# Altium footprint library EMDC_Packages.PcbLib: 274 footprints (part 11 of 18)
Each footprint in its own frame and in the unit in brackets; x right, y up, seen from the top. Pads: shape width x height; smd on the part's side, far side on the other; paste and mask are expansions set on the pad; w line width, h text height; cw(c..) or ccw(c..) is an arc to the next point about the centre after c.
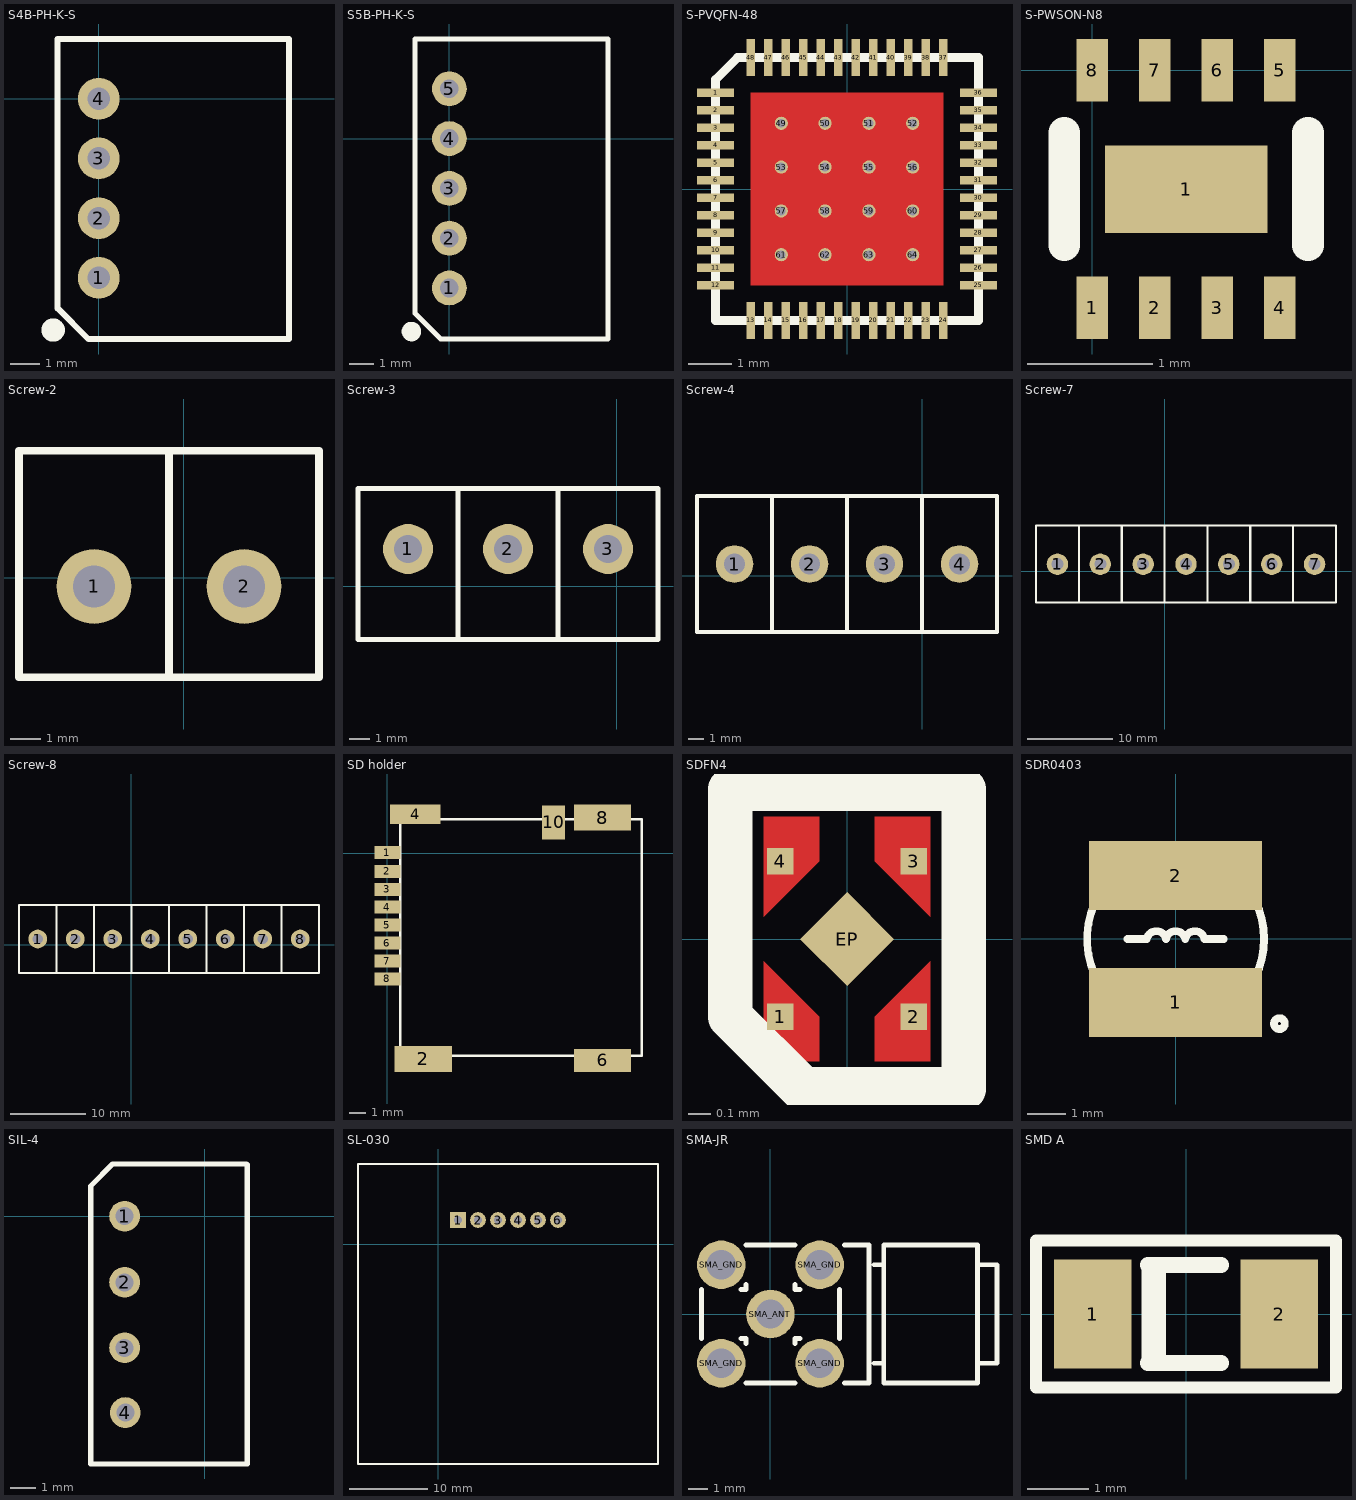
[diagram p10: the footprints below, top view; thin cyan lines are the x and y axes]

## S4B-PH-K-S [mm] "JST S4B-PH-K-S connector"
pads (4):
  round 1.4 hole 0.75: 1(0,-6) 2(0,-4) 3(0,-2) 4(0,0)
Top Overlay:
  circle w0.5: c-1.525,-7.75 r0.141
  lines w0.2: -1.375,-7.025 -0.35,-8.05 6.375,-8.05 6.375,2 -1.375,2 -1.375,-7.025
3D body "S4B-PH-K-S.STEP": height 4.8, standoff -3.4, extent -1.325,-7.95 6.275,1.95

## S5B-PH-K-S [mm] "JST S5B-PH-K-S connector"
pads (5):
  round 1.4 hole 0.75: 1(0,-6) 2(0,-4) 3(0,-2) 4(0,0) 5(0,2)
Top Overlay:
  circle w0.5: c-1.525,-7.75 r0.141
  lines w0.2: -1.375,-7.025 -1.375,4 6.375,4 6.375,-8.05 -0.35,-8.05 -1.375,-7.025
3D body "S5B-PH-K-S.STEP": height 4.8, standoff -3.4, extent -1.3,-7.95 6.3,3.95

## S-PVQFN-48 [mm] "S-PVQFN 48pin TI package"
pads (64):
  rect 0.85x0.2 smd: 1(-3,2.2) 2(-3,1.8) 3(-3,1.4) 4(-3,1) 5(-3,0.6) 6(-3,0.2) 7(-3,-0.2) 8(-3,-0.6) 9(-3,-1) 10(-3,-1.4) 11(-3,-1.8) 12(-3,-2.2) 25(3,-2.2) 26(3,-1.8) 27(3,-1.4) 28(3,-1) 29(3,-0.6) 30(3,-0.2) 31(3,0.2) 32(3,0.6) 33(3,1) 34(3,1.4) 35(3,1.8) 36(3,2.2)
  rect 0.2x0.85 smd: 13(-2.2,-3) 14(-1.8,-3) 15(-1.4,-3) 16(-1,-3) 17(-0.6,-3) 18(-0.2,-3) 19(0.2,-3) 20(0.6,-3) 21(1,-3) 22(1.4,-3) 23(1.8,-3) 24(2.2,-3) 37(2.2,3) 38(1.8,3) 39(1.4,3) 40(1,3) 41(0.6,3) 42(0.2,3) 43(-0.2,3) 44(-0.6,3) 45(-1,3) 46(-1.4,3) 47(-1.8,3) 48(-2.2,3)
  round 0.3 hole 0.2 paste+0 mask+0: 49(-1.5,1.5) 50(-0.5,1.5) 51(0.5,1.5) 52(1.5,1.5) 53(-1.5,0.5) 54(-0.5,0.5) 55(0.5,0.5) 56(1.5,0.5) 57(-1.5,-0.5) 58(-0.5,-0.5) 59(0.5,-0.5) 60(1.5,-0.5) 61(-1.5,-1.5) 62(-0.5,-1.5) 63(0.5,-1.5) 64(1.5,-1.5)
Top Layer:
  rectangle: -2.2,-2.2 2.2,2.2
Top Overlay:
  lines w0.2: -3,-3 -3,2.5 -2.5,3 3,3 3,-3 -3,-3
Top Solder:
  rectangle: -2.3,-2.3 2.3,2.3
3D body "User Library-PVQFN-N48.STEP": height 0.95, standoff -0.05, extent -3,-3 3.02,3.02

## S-PWSON-N8 [mm]
pads (9):
  rect 0.25x0.5 smd: 1(0,-1.9) 2(0.5,-1.9) 3(1,-1.9) 4(1.5,-1.9) 5(1.5,0) 6(1,0) 7(0.5,0) 8(0,0)
  rect 1.3x0.7 smd: 1(0.75,-0.95)
Top Overlay:
  lines w0.254: -0.225,-1.4 -0.225,-0.5 ; 1.725,-1.4 1.725,-0.5

## Screw-2 [mm]
pads (2):
  round 2.5 hole 1.4: 1(-3,-0.3) 2(2,-0.3)
Top Overlay:
  lines w0.254: -0.5,-3.325 -0.5,4.2 ; -5.5,-3.325 -5.5,4.225 4.5,4.225 4.5,-3.325 -5.5,-3.325
3D body "User Library-Terminal-Screw-3A-2way.STEP": height 10, standoff -3, extent -6.075,-3.3 4.525,4.3

## Screw-3 [mm]
pads (3):
  round 2.5 hole 1.4: 1(-10.45,1.875) 2(-5.45,1.875) 3(-0.45,1.875)
Top Overlay:
  lines w0.254: -7.95,-2.625 -7.95,4.9 ; -2.95,-2.6 -2.95,4.9 ; -12.95,-2.65 2.05,-2.65 2.05,4.9 -12.95,4.9 -12.95,-2.65
3D body "User Library-Terminal-Screw-3A-3way.step": height 10, standoff -3, extent -12.95,-2.7 2.65,4.9

## Screw-4 [mm]
pads (4):
  round 2.5 hole 1.4: 1(-12.5,0.8) 2(-7.5,0.8) 3(-2.5,0.8) 4(2.5,0.8)
Top Overlay:
  lines w0.254: -10,-3.7 -10,5.3 ; 0,-3.7 0,5.3 ; -5,-3.725 -15,-3.725 -15,5.325 -5,5.325 ; -5,-3.725 -5,5.325 ; -5,-3.725 5,-3.725 5,5.325 -5,5.325 ; -5,-3.725 -5,5.325
3D body "User Library-2 Way PCB Screw Terminal Block 5mm.STEP": height 15.2, standoff -3.5, extent -5,-3.7 5,5.3
3D body "User Library-2 Way PCB Screw Terminal Block 5mm.STEP": height 15.2, standoff -3.5, extent -15,-3.7 -5,5.3

## Screw-7 [mm]
pads (7):
  round 2.5 hole 1.4: 1(-12.5,0.8) 2(-7.5,0.8) 3(-2.5,0.8) 4(2.5,0.8) 5(7.5,0.8) 6(12.5,0.8) 7(17.5,0.8)
Top Overlay:
  lines w0.254: -10,-3.675 -10,5.275 ; -5,-3.65 -5,5.3 ; 5,5.275 5,-3.675 ; 10,-3.675 10,5.275 ; 10,-3.65 10,5.3 ; 15,-3.65 15,5.3 ; 0,-3.675 0,5.325 ; 0,-3.675 -15,-3.675 -15,5.325 0,5.325 ; 0,-3.675 0,5.325 ; 0,-3.675 15,-3.675 15,5.325 0,5.325 ; 5,-3.675 5,5.325 20,5.325 20,-3.675 5,-3.675
3D body "User Library-2 Way PCB Screw Terminal Block 5mm.STEP": height 15.2, standoff -3.5, extent 10,-3.7 20,5.3
3D body "User Library-2 Way PCB Screw Terminal Block 5mm.STEP": height 15.2, standoff -3.5, extent 0,-3.7 10,5.3
3D body "User Library-3 Way PCB Screw Terminal Block 5mm.STEP": height 15.2, standoff -3.5, extent -14.975,-3.675 0.025,5.325

## Screw-8 [mm]
pads (8):
  round 2.5 hole 1.4: 1(-12.5,0.8) 2(-7.5,0.8) 3(-2.5,0.8) 4(2.5,0.8) 5(7.5,0.8) 6(12.5,0.8) 7(17.5,0.8) 8(22.5,0.8)
Top Overlay:
  lines w0.254: -10,-3.7 -10,5.3 ; 0,-3.7 0,5.3 ; 10,-3.7 10,5.3 ; 20,-3.7 20,5.3 ; -5,-3.725 -15,-3.725 -15,5.325 -5,5.325 ; -5,-3.725 -5,5.325 ; -5,-3.725 5,-3.725 ; -5,-3.725 -5,5.325 ; -5,5.325 5,5.325 ; 5,-3.725 5,5.325 ; 5,-3.725 15,-3.725 ; 5,-3.725 5,5.325 ; 5,5.325 15,5.325 ; 15,-3.725 15,5.325 ; 15,-3.725 25,-3.725 25,5.325 15,5.325 ; 15,-3.725 15,5.325
3D body "User Library-2 Way PCB Screw Terminal Block 5mm.STEP": height 15.2, standoff -3.5, extent -15,-3.7 -5,5.3
3D body "User Library-2 Way PCB Screw Terminal Block 5mm.STEP": height 15.2, standoff -3.5, extent -5,-3.7 5,5.3
3D body "User Library-2 Way PCB Screw Terminal Block 5mm.STEP": height 15.2, standoff -3.5, extent 5,-3.7 15,5.3
3D body "User Library-2 Way PCB Screw Terminal Block 5mm.STEP": height 15.2, standoff -3.5, extent 15,-3.7 25,5.3

## SD holder [mm]
pads (13):
  rect 1.6x0.8 smd: 1(0,0.05) 2(0,-1.1) 3(0,-2.2) 4(0,-3.3) 5(0,-4.4) 6(0,-5.5) 7(0,-6.6) 8(0,-7.7)
  rect 3.5x1.6 smd: 2(2.2,-12.6) 8(13.2,2.2)
  rect 3.1x1.2 smd: 4(1.7,2.4)
  rect 3.5x1.4 smd: 6(13.2,-12.7)
  rect 1.4x2.1 smd: 10(10.2,1.9)
Top Overlay:
  lines w0.15: 0.8,-12.4 15.6,-12.4 15.6,2.1 0.8,2.1 0.8,-12.4

## SDFN4 [mm]
pads (5):
  rect 0.12x0.12 smd: 1(-0.3,-0.35) 2(0.3,-0.35) 3(0.3,0.35) 4(-0.3,0.35)
  rect 0.3x0.3 smd rot 45 mask+0: EP(0,0)
Top Layer:
  region: 0.375,-0.1 0.375,-0.55 0.125,-0.55 0.125,-0.35
  region: 0.375,0.1 0.375,0.55 0.125,0.55 0.125,0.35
  region: -0.375,0.1 -0.375,0.55 -0.125,0.55 -0.125,0.35
  region: -0.375,-0.1 -0.375,-0.55 -0.125,-0.55 -0.125,-0.35
Top Overlay:
  lines w0.2: -0.525,-0.35 -0.525,0.675 0.525,0.675 0.525,-0.675 -0.2,-0.675 -0.525,-0.35
Top Solder:
  rectangle: -0.5,-0.5 0.5,0.5
3D body: height 0.38, standoff 0, extent -0.4,-0.4 0.4,0.4

## SDR0403 [mm] "Bourns Inductor SDR0403 series"
pads (2):
  rect 4.5x1.8 smd: 1(0,-1.65) 2(0,1.65)
Top Overlay:
  circle w0.2: c0,0 r2.3
  circle w0.2: c2.7,-2.2 r0.141
  lines w0.2: -1.25,0 -0.75,0 cw(c-0.5,-0.05) -0.25,0 cw(c0,-0.05) 0.25,0 cw(c0.5,-0.05) 0.75,0 1.25,0
3D body "User Library-Inductor SDR0403 Series.STEP": height 3.25, standoff 0, extent -2.25,-2.201 2.25,2.201

## SIL-4 [mm]
pads (4):
  round 1.2 hole 0.7: 1(-3.125,0) 2(-3.125,-2.575) 3(-3.125,-5.125) 4(-3.1,-7.65)
Top Overlay:
  lines w0.2: -4.445,-9.652 -4.445,1.18 -3.593,2.032 1.628,2.032 1.651,2.009 1.651,-9.652 -4.445,-9.652
3D body "User Library-SIL-K4.STEP": height 10.26, standoff -2.4, extent -4.45,-9.7 1.66,2

## SL-030 [mm] "RFID reader module"
pads (6):
  rect 2x2 hole 1: 1(2.54,3.048)
  round 2 hole 1: 2(5.08,3.048) 3(7.62,3.048) 4(10.16,3.048) 5(12.7,3.048) 6(15.24,3.048)
Top Overlay:
  lines w0.254: -10.16,-27.94 -10.16,10.16 27.94,10.16 27.94,-27.94 -10.16,-27.94

## SMA-JR [mm]
pads (5):
  round 2.5 hole 1.5: SMA_ANT(0,0) SMA_GND(-2.54,-2.54) SMA_GND(-2.54,2.54) SMA_GND(2.54,-2.54) SMA_GND(2.54,2.54)
Top Overlay:
  lines w0.254: -3.556,-1.27 -3.556,1.27 ; -1.524,-1.27 -1.27,-1.27 -1.27,-1.524 ; -1.524,1.27 -1.27,1.27 -1.27,1.524 ; -1.27,-3.556 1.27,-3.556 ; -1.27,3.556 1.27,3.556 ; 1.27,-1.524 1.27,-1.27 1.524,-1.27 ; 1.27,1.524 1.27,1.27 1.524,1.27 ; 3.556,-1.27 3.556,1.27 ; 3.81,-3.556 5.08,-3.556 5.08,3.556 3.81,3.556 ; 5.334,-2.54 5.842,-2.54 ; 5.334,2.54 5.842,2.54 ; 10.668,-2.54 11.684,-2.54 11.684,2.54 10.668,2.54 ; 5.842,-3.556 5.842,3.556 10.668,3.556 10.668,-3.556 5.842,-3.556

## SMD A [mil] "SMD A Tantalum electrolytic capacitor"
pads (2):
  rect 50x70 smd: 1(-60.04,0) 2(59.96,0)
Top Overlay:
  lines w7.87: -24.61,-31.5 -24.61,31.5 ; -16.73,-31.5 -16.73,31.5 ; -96.46,-47.24 96.46,-47.24 96.46,47.24 -96.46,47.24 -96.46,-47.24
  lines w10: -24.61,-31.5 22.64,-31.5 ; -24.61,31.5 22.64,31.5
3D body "User Library-Tantalum Cap Case A.STEP": height 63, standoff -0.03, extent -61.02,-31.5 64.96,31.5